# Altium schematic symbol library IC_TI.SCHLIB: 1162 symbols (part 1 of 8) (continued)
## CD4013BM96
designator U?
Integrated Circuit; Manufacturer_Name: Texas Instruments; Manufacturer_Part_Number: CD4013BM96; Datasheet Link: http://www.ti.com/lit/gpn/cd4013b; Height: 1.75mm; Mouser Part Number: 595-CD4013BM96; Mouser Price/Stock: https://www.mouser.com/Search/Refine.aspx?Keyword=595-CD4013BM96; RS Part Number: 6626825P; RS Price/Stock: http://uk.rs-online.com/web/p/products/6626825P
footprint SOIC14_1.27
pins: 1 Q1, 2 ~{Q1}, 3 CLOCK1, 4 RESET1, 5 D1, 6 SET1, 7 VSS, 8 SET2, 9 D2, 10 RESET2, 11 CLOCK2, 12 ~{Q2}, 13 Q2, 14 VDD

## CD4015BEE4
designator U?
Integrated Circuit; Manufacturer_Name: Texas Instruments; Manufacturer_Part_Number: CD4015BEE4; Datasheet Link: http://www.ti.com/lit/ds/symlink/cd4015b.pdf; Height: 5.08mm; Mouser Part Number: 595-CD4015BEE4; Mouser Price/Stock: https://www.mouser.com/Search/Refine.aspx?Keyword=595-CD4015BEE4; RS Part Number: 1450191; RS Price/Stock: http://uk.rs-online.com/web/p/products/1450191
footprint DIP16-A
pins: 1 CLK_B (in), 2 Q4_B, 3 Q3_A, 4 Q2_A, 5 Q1_A, 6 RESET_A, 7 DATA_A, 8 VSS (power), 9 CLK_A (in), 10 Q4_A, 11 Q3_B, 12 Q2_B, 13 Q1_B, 14 RESET_B, 15 DATA_B, 16 VDD (power)

## CD4015BM96
designator U?
Integrated Circuit; Manufacturer_Name: Texas Instruments; Manufacturer_Part_Number: CD4015BM96; Datasheet Link: http://www.ti.com/general/docs/lit/getliterature.tsp?genericPartNumber=CD4015B&&fileType=pdf; Height: 1.75mm; Mouser Part Number: 595-CD4015BM96; Mouser Price/Stock: https://www.mouser.com/Search/Refine.aspx?Keyword=595-CD4015BM96
footprint SOIC16_1.27
pins: 1 CLOCK_B, 2 Q4_B, 3 Q3_A, 4 Q2_A, 5 Q1_A, 6 RESET_A, 7 DATA_A, 8 VSS, 9 CLOCK_A, 10 Q4A, 11 Q3_B, 12 Q2_B, 13 Q1_B, 14 RESET_B, 15 DATA_B, 16 VDD

## CD4016BM
designator U?
Integrated Circuit; Manufacturer_Name: Texas Instruments; Manufacturer_Part_Number: CD4016BM; Datasheet Link: http://www.ti.com/lit/gpn/cd4016b; Mouser Part Number: 595-CD4016BM; Mouser Price/Stock: https://www.mouser.com/Search/Refine.aspx?Keyword=595-CD4016BM; RS Part Number: 1450847; RS Price/Stock: http://uk.rs-online.com/web/p/products/1450847
footprint SOIC14_1.27
pins: 1 SIGA_IN, 2 SIGA_OUT, 3 SIGB_IN, 4 SIGB_OUT, 5 CONTROL_B, 6 CONTROL_C, 7 VSS, 8 SIGC_IN, 9 SIGC_OUT, 10 SIGD_OUT, 11 SIGD_IN, 12 CONTROL_D, 13 CONTROL_A, 14 VDD

## CD4017BM
designator U?
Integrated Circuit; Manufacturer_Name: Texas Instruments; Manufacturer_Part_Number: CD4017BM; Datasheet Link: http://uk.rs-online.com/web/p/products/6629543; Height: 1.75mm; Mouser Part Number: 595-CD4017BM; Mouser Price/Stock: https://www.mouser.com/Search/Refine.aspx?Keyword=595-CD4017BM; RS Part Number: 9222896; RS Price/Stock: http://uk.rs-online.com/web/p/products/9222896
footprint SOIC16_1.27
pins: 1 5, 2 1, 3 0, 4 2, 5 6, 6 7, 7 3, 8 VSS, 9 8, 10 4, 11 9, 12 CARRY_OUT, 13 CLOCK_INHIBIT, 14 CLOCK, 15 RESET, 16 VDO

## CD4021BEE4
designator U?
Integrated Circuit; Manufacturer_Name: Texas Instruments; Manufacturer_Part_Number: CD4021BEE4; Datasheet Link: http://www.ti.com/lit/ds/symlink/cd4021b.pdf; Height: 5.08mm; Mouser Part Number: 595-CD4021BEE4; Mouser Price/Stock: https://www.mouser.com/Search/Refine.aspx?Keyword=595-CD4021BEE4; RS Part Number: 6629565P; RS Price/Stock: http://uk.rs-online.com/web/p/products/6629565P
footprint DIP16-A
pins: 1 P1-8, 2 Q6, 3 Q8, 4 P1-4, 5 P1-3, 6 P1-2, 7 P1-1, 8 VSS (power), 9 P/S_CTRL, 10 CLK (in), 11 SER_IN (in), 12 Q7, 13 P1-5, 14 P1-6, 15 P1-7, 16 VDD (power)

## CD4021BM
designator U?
Integrated Circuit; Manufacturer_Name: Texas Instruments; Manufacturer_Part_Number: CD4021BM; Datasheet Link: http://www.ti.com/lit/gpn/cd4021b; Height: 1.75mm; Mouser Part Number: 595-CD4021BM; Mouser Price/Stock: https://www.mouser.com/Search/Refine.aspx?Keyword=595-CD4021BM; RS Part Number: 6629569P; RS Price/Stock: http://uk.rs-online.com/web/p/products/6629569P
footprint SOIC16_1.27
pins: 1 PAR._IN_1, 2 Q6, 3 Q8, 4 PAR._IN_2, 5 PAR._IN_3, 6 PAR._IN_4, 7 PAR._IN_5, 8 VSS, 9 PAR_SER_CONT, 10 CLOCK, 11 SER._IN, 12 Q7, 13 PAR._IN_6, 14 PAR._IN_7, 15 PAR._IN_8, 16 VDD

## CD4023BEE4
designator U?
Integrated Circuit; Manufacturer_Name: Texas Instruments; Manufacturer_Part_Number: CD4023BEE4; Datasheet Link: http://www.ti.com/lit/ds/symlink/cd4023b.pdf; Height: 5.08mm; Mouser Part Number: 595-CD4023BEE4; Mouser Price/Stock: https://www.mouser.com/Search/Refine.aspx?Keyword=595-CD4023BEE4; RS Part Number: 1449999; RS Price/Stock: http://uk.rs-online.com/web/p/products/1449999
footprint DIP14-A
pins: 1 A, 2 B, 3 D, 4 E, 5 F, 6 K, 7 VSS (power), 8 C, 9 J, 10 L, 11 I, 12 H, 13 G, 14 VDD (power)

## CD4023BPWR
designator U?
Integrated Circuit; Manufacturer_Name: Texas Instruments; Manufacturer_Part_Number: CD4023BPWR; Datasheet Link: http://www.ti.com/lit/gpn/cd4023b; Height: 1.2mm; Mouser Part Number: 595-CD4023BPWR; Mouser Price/Stock: https://www.mouser.com/Search/Refine.aspx?Keyword=595-CD4023BPWR
footprint TSSOP14_0.65 (TSOP, 14-Leads, Body 5.00x4.40mm, Pitch 0.65mm, Thermal Pad 2.31x2.46mm, IPC Low Density)
pins: 1 A, 2 B, 3 D, 4 E, 5 F, 6 K~{DEF}, 7 VSS, 8 C, 9 J~{ABC}, 10 L~{GHI}, 11 I, 12 H, 13 G, 14 VDD

## CD4028BM
designator U?
Integrated Circuit; Manufacturer_Name: Texas Instruments; Manufacturer_Part_Number: CD4028BM; Datasheet Link: https://componentsearchengine.com/Datasheets/2/CD4028BM.pdf; Height: 1.75mm; Mouser Part Number: 595-CD4028BM; Mouser Price/Stock: https://www.mouser.com/Search/Refine.aspx?Keyword=595-CD4028BM
footprint SOIC16_1.27
pins: 1 4 (out), 2 (out), 3 0 (out), 4 7 (out), 5 9 (out), 6 5 (out), 7 6 (out), 8 VSS (power), 9 8 (out), 10 A (in), 11 D (in), 12 C (in), 13 B (in), 14 1 (out), 15 3 (out), 16 VDD (power)

## CD4040BEE4
designator U?
Integrated Circuit; Manufacturer_Name: Texas Instruments; Manufacturer_Part_Number: CD4040BEE4; Datasheet Link: http://www.ti.com/lit/ds/symlink/cd4020b.pdf; Height: 5.08mm; Mouser Part Number: 595-CD4040BEE4; Mouser Price/Stock: https://www.mouser.com/Search/Refine.aspx?Keyword=595-CD4040BEE4; RS Part Number: 2509293942; RS Price/Stock: http://uk.rs-online.com/web/p/products/2509293942
footprint DIP16-A
pins: 1 Q12, 2 Q6, 3 Q5, 4 Q7, 5 Q4, 6 Q3, 7 Q2, 8 VSS, 9 Q1, 10 INPUT_PULSES, 11 RESET, 12 Q9, 13 Q8, 14 Q10, 15 Q11, 16 VDD

## CD4040BM96
designator U?
Integrated Circuit; Manufacturer_Name: Texas Instruments; Manufacturer_Part_Number: CD4040BM96; Datasheet Link: http://www.ti.com/lit/gpn/cd4040b; Height: 1.75mm; Mouser Part Number: 595-CD4040BM96; Mouser Price/Stock: https://www.mouser.com/Search/Refine.aspx?Keyword=595-CD4040BM96
footprint SOIC16_1.27
pins: 1 Q12, 2 Q6_1, 3 Q5, 4 Q7, 5 Q4, 6 Q3, 7 Q2, 8 VSS, 9 QI, 10 Q, 11 R, 12 Q9, 13 Q6_2, 14 Q10, 15 Q11, 16 VDD

## CD4042BD
designator U?
Integrated Circuit; Manufacturer_Name: Texas Instruments; Manufacturer_Part_Number: CD4042BD; Mouser Part Number: 595-CD4042BD; Mouser Price/Stock: https://www.mouser.com/Search/Refine.aspx?Keyword=595-CD4042BD
footprint SOIC16_1.27
pins: 1 Q4, 2 Q1, 3 ~Q1, 4 D1, 5 CLOCK, 6 POLARITY, 7 D2, 8 VSS, 9 ~Q2, 10 Q2, 11 Q3, 12 ~Q3, 13 D3, 14 D4, 15 ~Q4, 16 VDD

## CD4042BEE4
designator U?
Integrated Circuit; Manufacturer_Name: Texas Instruments; Manufacturer_Part_Number: CD4042BEE4; Datasheet Link: http://www.ti.com/lit/ds/symlink/cd4042b.pdf; Height: 5.08mm; Mouser Part Number: 595-CD4042BEE4; Mouser Price/Stock: https://www.mouser.com/Search/Refine.aspx?Keyword=595-CD4042BEE4; RS Part Number: 7092378P; RS Price/Stock: http://uk.rs-online.com/web/p/products/7092378P
footprint DIP16-A
pins: 1 Q4, 2 Q1, 3 ~{Q1}, 4 D1, 5 CLK (in), 6 POL, 7 D2, 8 VSS (power), 9 ~{Q2}, 10 Q2, 11 Q3, 12 ~{Q3}, 13 D3, 14 D4, 15 ~{Q4}, 16 VDD (power)

## CD4043BDR
designator U?
Integrated Circuit; Manufacturer_Name: Texas Instruments; Manufacturer_Part_Number: CD4043BDR; Datasheet Link: http://www.ti.com/lit/ds/symlink/cd4043b.pdf; Height: 1.75mm; Mouser Part Number: 595-CD4043BDR; Mouser Price/Stock: https://www.mouser.com/Search/Refine.aspx?Keyword=595-CD4043BDR
footprint SOIC16_1.27
pins: 1 Q4, 2 Q1, 3 R1, 4 S1, 5 ENABLE, 6 S2, 7 R2, 8 VSS, 9 Q2, 10 Q3, 11 R3, 12 S3, 13 NC, 14 S4, 15 R4, 16 VDD

## CD4043BDW
designator U?
Integrated Circuit; Manufacturer_Name: Texas Instruments; Manufacturer_Part_Number: CD4043BDW; Datasheet Link: http://www.ti.com/lit/gpn/cd4043b; Height: 2.65mm; Mouser Part Number: 595-CD4043BDW; Mouser Price/Stock: https://www.mouser.com/Search/Refine.aspx?Keyword=595-CD4043BDW; RS Part Number: 8072353; RS Price/Stock: http://uk.rs-online.com/web/p/products/8072353
footprint SOIC16W_1.27
pins: 1 Q4, 2 Q1, 3 R1, 4 S1, 5 ENABLE, 6 S2, 7 R2, 8 VSS, 9 Q2, 10 Q3, 11 R3, 12 S3, 13 NC, 14 S4, 15 R4, 16 VDD

## CD4043BE
designator U?
Integrated Circuit; Manufacturer_Name: Texas Instruments; Manufacturer_Part_Number: CD4043BE; Datasheet Link: http://www.ti.com/lit/ds/symlink/cd4043b.pdf; Height: 5.08mm; Mouser Part Number: 595-CD4043BE; Mouser Price/Stock: https://www.mouser.com/Search/Refine.aspx?Keyword=595-CD4043BE; RS Part Number: 2508238859; RS Price/Stock: http://uk.rs-online.com/web/p/products/2508238859
footprint DIP16-A
pins: 1 Q4, 2 Q1, 3 R1, 4 S1, 5 ENABLE, 6 S2, 7 R2, 8 VSS (power), 9 Q2, 10 Q3, 11 R3, 12 S3, 13 NC, 14 S4, 15 R4, 16 VDD (power)

## CD4046BEE4
designator U?
Integrated Circuit; Manufacturer_Name: Texas Instruments; Manufacturer_Part_Number: CD4046BEE4; Datasheet Link: http://www.ti.com/lit/ds/symlink/cd4046b.pdf; Height: 5.08mm; Mouser Part Number: 595-CD4046BEE4; Mouser Price/Stock: https://www.mouser.com/Search/Refine.aspx?Keyword=595-CD4046BEE4; RS Part Number: 7091965P; RS Price/Stock: http://au.rs-online.com/web/p/products/7091965P
footprint DIP16-A
pins: 1 PP, 2 PC1_OUT (out), 3 COMP, 4 VCOOUT (out), 5 INH (in), 6 C1_1, 7 C1_2, 8 VSS (power), 9 VCOIN (in), 10 DEMO_OUT (out), 11 R1, 12 R2, 13 PC2_OUT (out), 14 SIG, 15 ZENER, 16 VDD (power)

## CD4046BPW
designator U?
Integrated Circuit; Manufacturer_Name: Texas Instruments; Manufacturer_Part_Number: CD4046BPW; Datasheet Link: http://www.ti.com/lit/ds/symlink/cd4046b.pdf; Height: 1.2mm; Mouser Part Number: 595-CD4046BPW; Mouser Price/Stock: https://www.mouser.com/Search/Refine.aspx?Keyword=595-CD4046BPW; RS Part Number: 1451118; RS Price/Stock: http://au.rs-online.com/web/p/products/1451118
footprint TSSOP16_0.65 (Shrink Small Outline; 16 Leads; Body Width 4.4 mm; Pitch 0.65 mm)
pins: 1 PHASE_PULSES, 2 PHASE_COMP_I_OUT, 3 COMPARATOR_IN, 4 VCO_OUT, 5 INHIBIT, 6 CI(1), 7 CI(2), 8 VSS (power), 9 VCO_IN, 10 DEMODULATOR_OUT, 11 R1_TO_VSS, 12 R2_TO_VSS, 13 PHASE_COMP_II_OUT, 14 SIGNAL_IN, 15 ZENER, 16 VDD (power)

## CD4047BE
designator U?
Integrated Circuit; Manufacturer_Name: Texas Instruments; Manufacturer_Part_Number: CD4047BE; Datasheet Link: http://www.ti.com/lit/ds/symlink/cd4047b.pdf; Height: 5.08mm; Mouser Part Number: 595-CD4047BE; Mouser Price/Stock: https://www.mouser.com/Search/Refine.aspx?Keyword=595-CD4047BE; RS Part Number: 2508238887; RS Price/Stock: http://uk.rs-online.com/web/p/products/2508238887
footprint DIP14-A
pins: 1 C, 2 R, 3 R-C_COMMON, 4 ~{ASTABLE}, 5 ASTABLE, 6 -TRIGGER, 7 VSS (power), 8 +TRIGGER, 9 EXT.RESERT, 10 Q, 11 ~{Q}, 12 RETRIGGER, 13 OSCOUT (out), 14 VDD (power)

## CD4047BM
designator U?
Integrated Circuit; Manufacturer_Name: Texas Instruments; Manufacturer_Part_Number: CD4047BM; Datasheet Link: http://www.ti.com/lit/gpn/cd4047b; Mouser Part Number: 595-CD4047BM; Mouser Price/Stock: https://www.mouser.com/Search/Refine.aspx?Keyword=595-CD4047BM; RS Part Number: 1450420; RS Price/Stock: http://uk.rs-online.com/web/p/products/1450420
footprint SOIC14_1.27
pins: 1 C, 2 R, 3 R-C_COMMON, 4 ~ASTABLE, 5 ASTABL, 6 -TRIGGER, 7 VSS, 8 +TRIGGER, 9 EXT_RESET, 10 Q, 11 ~Q, 12 RETRIGGER, 13 OSC_OUT, 14 VDD

## CD4049UBDR
designator U?
Integrated Circuit; Manufacturer_Name: Texas Instruments; Manufacturer_Part_Number: CD4049UBDR; Datasheet Link: http://www.ti.com/lit/gpn/cd4049ub; Height: 1.75mm; Mouser Part Number: 595-CD4049UBDR; Mouser Price/Stock: https://www.mouser.com/Search/Refine.aspx?Keyword=595-CD4049UBDR
footprint SOIC16_1.27
pins: 1 VCC, 2 G, 3 A, 4 H, 5 B, 6 I, 7 C, 8 VSS, 9 D, 10 J, 11 E, 12 K, 13 NC_1, 14 F, 15 L, 16 NC_2

## CD4049UBE
designator U?
Integrated Circuit; Manufacturer_Name: Texas Instruments; Manufacturer_Part_Number: CD4049UBE; Datasheet Link: http://www.ti.com/lit/ds/symlink/cd4049ub.pdf; Height: 5.08mm; Mouser Part Number: 595-CD4049UBE; Mouser Price/Stock: https://www.mouser.com/Search/Refine.aspx?Keyword=595-CD4049UBE; RS Part Number: 2508238893; RS Price/Stock: http://uk.rs-online.com/web/p/products/2508238893
footprint DIP16-A
pins: 1 VCC (power), 2 G=~{A}, 3 A, 4 H=~{B}, 5 B, 6 I=~{C}, 7 C, 8 VSS (power), 9 D, 10 J=~{D}, 11 E, 12 K=~{E}, 13 NC, 14 F, 15 L=~{F}, 16 NC_1

## CD4051BEE4
designator U?
Integrated Circuit; Manufacturer_Name: Texas Instruments; Manufacturer_Part_Number: CD4051BEE4; Datasheet Link: http://www.ti.com/lit/ds/symlink/cd4051b.pdf; Height: 5.08mm; Mouser Part Number: 595-CD4051BEE4; Mouser Price/Stock: https://www.mouser.com/Search/Refine.aspx?Keyword=595-CD4051BEE4; RS Part Number: 9236700; RS Price/Stock: http://uk.rs-online.com/web/p/products/9236700
footprint DIP16-A
pins: 1 CHANNELS_IN/OUT_4 (out), 2 CHANNELS_IN/OUT_6 (out), 3 COM_O/I, 4 CHANNELS_IN/OUT_7 (out), 5 CHANNELS_IN/OUT_5 (out), 6 INH (in), 7 VEE, 8 VSS (power), 9 C, 10 B, 11 A, 12 CHANNELS_IN/OUT_3 (out), 13 CHANNELS_IN/OUT_0 (out), 14 CHANNELS_IN/OUT_1 (out), 15 CHANNELS_IN/OUT_2 (out), 16 VDD (power)

## CD4051BM96
designator U?
Integrated Circuit; Manufacturer_Name: Texas Instruments; Manufacturer_Part_Number: CD4051BM96; Datasheet Link: http://www.ti.com/general/docs/lit/getliterature.tsp?genericPartNumber=CD4051B&&fileType=pdf; Height: 1.75mm; Mouser Part Number: 595-CD4051BM96; Mouser Price/Stock: https://www.mouser.com/Search/Refine.aspx?Keyword=595-CD4051BM96; RS Part Number: 1788947; RS Price/Stock: http://uk.rs-online.com/web/p/products/1788947
footprint SOIC16_1.27
pins: 1 CH_4_IN/OUT, 2 CH_6_IN/OUT, 3 COM_OUT/IN, 4 CH_7_IN/OUT, 5 CH_5_IN/OUT, 6 INH, 7 VEE, 8 VSS, 9 C, 10 B, 11 A, 12 CH3_IN/OUT, 13 CH0_IN/OUT, 14 CH1_IN/OUT, 15 CH2_IN/OUT, 16 VDD

## CD4051BPW
designator U?
Integrated Circuit; Manufacturer_Name: Texas Instruments; Manufacturer_Part_Number: CD4051BPW; Mouser Part Number: 595-CD4051BPW; Mouser Price/Stock: https://www.mouser.com/Search/Refine.aspx?Keyword=595-CD4051BPW
footprint TSSOP16_0.65 (Shrink Small Outline; 16 Leads; Body Width 4.4 mm; Pitch 0.65 mm)
pins: 1 4, 2 6, 3 COM_OUT/IN, 4 7, 5, 6 INH, 7 VEE, 8 VSS, 9 C, 10 B, 11 A, 12 3, 13 0, 14 1, 15 2, 16 VDD

## CD4052BEE4
designator U?
Integrated Circuit; Manufacturer_Name: Texas Instruments; Manufacturer_Part_Number: CD4052BEE4; Datasheet Link: http://www.ti.com/lit/ds/symlink/cd4051b.pdf; Height: 5.08mm; Mouser Part Number: 595-CD4052BEE4; Mouser Price/Stock: https://www.mouser.com/Search/Refine.aspx?Keyword=595-CD4052BEE4; RS Part Number: 7091980P; RS Price/Stock: http://uk.rs-online.com/web/p/products/7091980P
footprint DIP16-A
pins: 1 Y_IN/OUT_0 (out), 2 Y_IN/OUT_2 (out), 3 Y_OUT/IN (out), 4 Y_IN/OUT_3 (out), 5 Y_IN/OUT_1 (out), 6 INH (in), 7 VEE, 8 VSS (power), 9 B, 10 A, 11 X_IN/OUT_3 (out), 12 X_IN/OUT_0 (out), 13 X_OUT/IN (out), 14 X_IN/OUT_1 (out), 15 X_IN/OUT_2 (out), 16 VDD (power)

## CD4052BM
designator U?
Integrated Circuit; Manufacturer_Name: Texas Instruments; Manufacturer_Part_Number: CD4052BM; Datasheet Link: http://www.ti.com/lit/ds/symlink/cd4052b.pdf; Height: 1.75mm; Mouser Part Number: 595-CD4052BM; Mouser Price/Stock: https://www.mouser.com/Search/Refine.aspx?Keyword=595-CD4052BM; RS Part Number: 6622656P; RS Price/Stock: http://uk.rs-online.com/web/p/products/6622656P
footprint SOIC16_1.27
pins: 1 0Y, 2 2Y, 3 Y, 4 3Y, 5 1Y, 6 INH (in), 7 VEE, 8 VSS (power), 9 B, 10 A, 11 3X, 12 0X, 13 X, 14 1X, 15 2X, 16 VDD (power)

## CD4053BM96
designator U?
Integrated Circuit; Manufacturer_Name: Texas Instruments; Manufacturer_Part_Number: CD4053BM96; Datasheet Link: http://www.ti.com/lit/ds/symlink/cd4053b.pdf; Height: 1.75mm; Mouser Part Number: 595-CD4053BM96; Mouser Price/Stock: https://www.mouser.com/Search/Refine.aspx?Keyword=595-CD4053BM96; RS Part Number: 1788952; RS Price/Stock: http://uk.rs-online.com/web/p/products/1788952
footprint SOIC16_1.27
pins: 1 BY, 2 BX, 3 CY_1, 4 OUT/IN_CX_OR_CY (out), 5 IN/OUT_CX (out), 6 INH (in), 7 VEE, 8 VSS (power), 9 CY_2, 10 B, 11 A, 12 AX, 13 AY, 14 OUT/IN_AX_OR_AY (out), 15 OUT/IN_BX_OR_BY (out), 16 VDD (power)

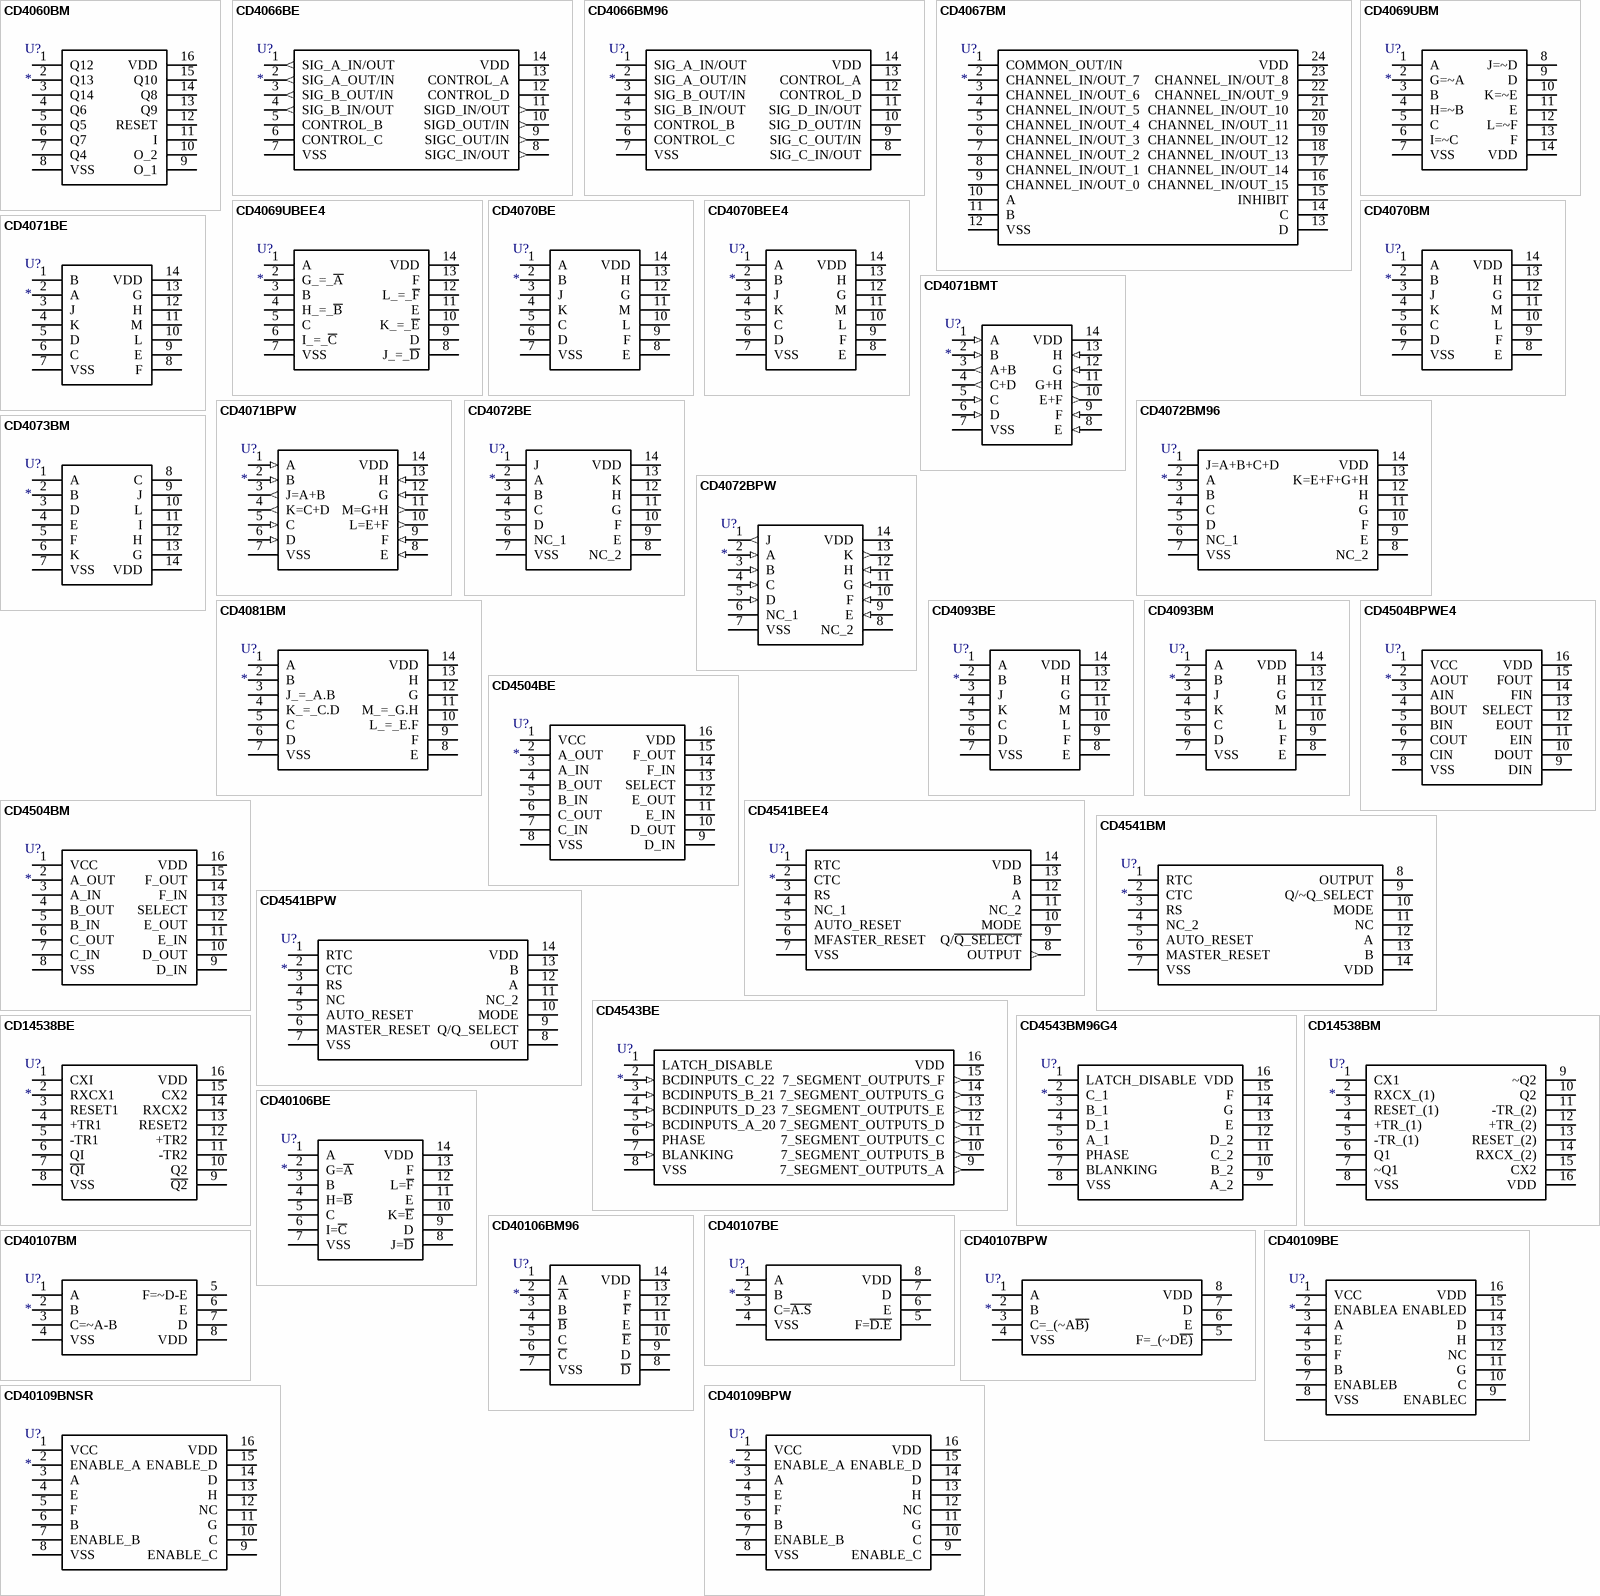
[diagram p4: symbols CD4060BM to CD40109BPW]

## CD4060BM
designator U?
Integrated Circuit; Manufacturer_Name: Texas Instruments; Manufacturer_Part_Number: CD4060BM; Datasheet Link: http://www.ti.com/lit/gpn/cd4060b; Height: 1.75mm; Mouser Part Number: 595-CD4060BM; Mouser Price/Stock: https://www.mouser.com/Search/Refine.aspx?Keyword=595-CD4060BM; RS Part Number: 1456607; RS Price/Stock: http://uk.rs-online.com/web/p/products/1456607
footprint SOIC16_1.27
pins: 1 Q12, 2 Q13, 3 Q14, 4 Q6, 5 Q5, 6 Q7, 7 Q4, 8 VSS, 9 O_1, 10 O_2, 11 I, 12 RESET, 13 Q9, 14 Q8, 15 Q10, 16 VDD

## CD4066BE
designator U?
Integrated Circuit; Manufacturer_Name: Texas Instruments; Manufacturer_Part_Number: CD4066BE; Datasheet Link: http://docs-emea.rs-online.com/webdocs/0b73/0900766b80b734d0.pdf; Height: 5.08mm; Mouser Part Number: 595-CD4066BE; Mouser Price/Stock: https://www.mouser.com/Search/Refine.aspx?Keyword=595-CD4066BE; RS Part Number: 2508239032; RS Price/Stock: http://uk.rs-online.com/web/p/products/2508239032
footprint DIP14-A
pins: 1 SIG_A_IN/OUT (out), 2 SIG_A_OUT/IN (out), 3 SIG_B_OUT/IN (out), 4 SIG_B_IN/OUT (out), 5 CONTROL_B, 6 CONTROL_C, 7 VSS (power), 8 SIGC_IN/OUT (out), 9 SIGC_OUT/IN (out), 10 SIGD_OUT/IN (out), 11 SIGD_IN/OUT (out), 12 CONTROL_D, 13 CONTROL_A, 14 VDD (power)

## CD4066BM96
designator U?
Integrated Circuit; Manufacturer_Name: Texas Instruments; Manufacturer_Part_Number: CD4066BM96; Datasheet Link: http://www.ti.com/lit/gpn/cd4066b; Height: 1.75mm; Mouser Part Number: 595-CD4066BM96; Mouser Price/Stock: https://www.mouser.com/Search/Refine.aspx?Keyword=595-CD4066BM96; RS Part Number: 1788951; RS Price/Stock: http://uk.rs-online.com/web/p/products/1788951
footprint SOIC14_1.27
pins: 1 SIG_A_IN/OUT, 2 SIG_A_OUT/IN, 3 SIG_B_OUT/IN, 4 SIG_B_IN/OUT, 5 CONTROL_B, 6 CONTROL_C, 7 VSS, 8 SIG_C_IN/OUT, 9 SIG_C_OUT/IN, 10 SIG_D_OUT/IN, 11 SIG_D_IN/OUT, 12 CONTROL_D, 13 CONTROL_A, 14 VDD

## CD4067BM
designator U?
Integrated Circuit; Manufacturer_Name: Texas Instruments; Manufacturer_Part_Number: CD4067BM; Datasheet Link: http://www.ti.com/lit/ds/symlink/cd4067b.pdf; Height: 2.65mm; Mouser Part Number: 595-CD4067BM; Mouser Price/Stock: https://www.mouser.com/Search/Refine.aspx?Keyword=595-CD4067BM; RS Part Number: 8096208P; RS Price/Stock: http://uk.rs-online.com/web/p/products/8096208P
footprint SOIC24W_1.27
pins: 1 COMMON_OUT/IN, 2 CHANNEL_IN/OUT_7, 3 CHANNEL_IN/OUT_6, 4 CHANNEL_IN/OUT_5, 5 CHANNEL_IN/OUT_4, 6 CHANNEL_IN/OUT_3, 7 CHANNEL_IN/OUT_2, 8 CHANNEL_IN/OUT_1, 9 CHANNEL_IN/OUT_0, 10 A, 11 B, 12 VSS, 13 D, 14 C, 15 INHIBIT, 16 CHANNEL_IN/OUT_15, 17 CHANNEL_IN/OUT_14, 18 CHANNEL_IN/OUT_13, 19 CHANNEL_IN/OUT_12, 20 CHANNEL_IN/OUT_11, 21 CHANNEL_IN/OUT_10, 22 CHANNEL_IN/OUT_9, 23 CHANNEL_IN/OUT_8, 24 VDD

## CD4069UBEE4
designator U?
Integrated Circuit; Manufacturer_Name: Texas Instruments; Manufacturer_Part_Number: CD4069UBEE4; Datasheet Link: http://www.ti.com/general/docs/lit/getliterature.tsp?genericPartNumber=CD4069UB&&fileType=pdf; Height: 5.08mm; Mouser Part Number: 595-CD4069UBEE4; Mouser Price/Stock: https://www.mouser.com/Search/Refine.aspx?Keyword=595-CD4069UBEE4; RS Part Number: 2509293958; RS Price/Stock: http://uk.rs-online.com/web/p/products/2509293958
footprint DIP14-A
pins: 1 A, 2 G_=_~{A}, 3 B, 4 H_=_~{B}, 5 C, 6 I_=_~{C}, 7 VSS, 8 J_=_~{D}, 9 D, 10 K_=_~{E}, 11 E, 12 L_=_~{F}, 13 F, 14 VDD

## CD4069UBM
designator U?
Integrated Circuit; Manufacturer_Name: Texas Instruments; Manufacturer_Part_Number: CD4069UBM; Datasheet Link: http://www.ti.com/lit/gpn/cd4069ub; Mouser Part Number: 595-CD4069UBM; Mouser Price/Stock: https://www.mouser.com/Search/Refine.aspx?Keyword=595-CD4069UBM; RS Part Number: 6629650P; RS Price/Stock: http://uk.rs-online.com/web/p/products/6629650P
footprint SOIC14_1.27
pins: 1 A, 2 G=~A, 3 B, 4 H=~B, 5 C, 6 I=~C, 7 VSS, 8 J=~D, 9 D, 10 K=~E, 11 E, 12 L=~F, 13 F, 14 VDD

## CD4070BE
designator U?
Integrated Circuit; Manufacturer_Name: Texas Instruments; Manufacturer_Part_Number: CD4070BE; Datasheet Link: http://docs-emea.rs-online.com/webdocs/0b73/0900766b80b73c67.pdf; Height: 5.08mm; Mouser Part Number: 595-CD4070BE; Mouser Price/Stock: https://www.mouser.com/Search/Refine.aspx?Keyword=595-CD4070BE; RS Part Number: 2508242476; RS Price/Stock: http://uk.rs-online.com/web/p/products/2508242476
footprint DIP14-A
pins: 1 A, 2 B, 3 J, 4 K, 5 C, 6 D, 7 VSS (power), 8 E, 9 F, 10 L, 11 M, 12 G, 13 H, 14 VDD (power)

## CD4070BEE4
designator U?
Integrated Circuit; Manufacturer_Name: Texas Instruments; Manufacturer_Part_Number: CD4070BEE4; Datasheet Link: http://docs-emea.rs-online.com/webdocs/0b73/0900766b80b73c67.pdf; Height: 5.08mm; Mouser Part Number: 595-CD4070BEE4; Mouser Price/Stock: https://www.mouser.com/Search/Refine.aspx?Keyword=595-CD4070BEE4; RS Part Number: 1450728; RS Price/Stock: http://uk.rs-online.com/web/p/products/1450728
footprint DIP14-A
pins: 1 A, 2 B, 3 J, 4 K, 5 C, 6 D, 7 VSS (power), 8 E, 9 F, 10 L, 11 M, 12 G, 13 H, 14 VDD (power)

## CD4070BM
designator U?
Integrated Circuit; Manufacturer_Name: Texas Instruments; Manufacturer_Part_Number: CD4070BM; Datasheet Link: http://docs-emea.rs-online.com/webdocs/0e6d/0900766b80e6d4a1.pdf; Height: 1.75mm; Mouser Part Number: 595-CD4070BM; Mouser Price/Stock: https://www.mouser.com/Search/Refine.aspx?Keyword=595-CD4070BM; RS Part Number: 1451087; RS Price/Stock: http://uk.rs-online.com/web/p/products/1451087
footprint SOIC14_1.27
pins: 1 A, 2 B, 3 J, 4 K, 5 C, 6 D, 7 VSS (power), 8 E, 9 F, 10 L, 11 M, 12 G, 13 H, 14 VDD (power)

## CD4071BE
designator U?
Integrated Circuit; Manufacturer_Name: Texas Instruments; Manufacturer_Part_Number: CD4071BE; Datasheet Link: http://www.ti.com/lit/ds/symlink/cd4071b.pdf; Height: 5.08mm; Mouser Part Number: 595-CD4071BE; Mouser Price/Stock: https://www.mouser.com/Search/Refine.aspx?Keyword=595-CD4071BE; RS Part Number: 2508242498; RS Price/Stock: http://uk.rs-online.com/web/p/products/2508242498
footprint DIP14-A
pins: 1 B, 2 A, 3 J, 4 K, 5 D, 6 C, 7 VSS (power), 8 F, 9 E, 10 L, 11 M, 12 H, 13 G, 14 VDD (power)

## CD4071BMT
designator U?
Integrated Circuit; Manufacturer_Name: Texas Instruments; Manufacturer_Part_Number: CD4071BMT; Datasheet Link: http://www.ti.com/lit/ds/symlink/cd4071b.pdf; Height: 1.75mm; Mouser Part Number: 595-CD4071BMT; Mouser Price/Stock: https://www.mouser.com/Search/Refine.aspx?Keyword=595-CD4071BMT
footprint SOIC14_1.27
pins: 1 A (in), 2 B (in), 3 A+B (out), 4 C+D (out), 5 C (in), 6 D (in), 7 VSS (power), 8 E (in), 9 F (in), 10 E+F (out), 11 G+H (out), 12 G (in), 13 H (in), 14 VDD (power)

## CD4071BPW
designator U?
Integrated Circuit; Manufacturer_Name: Texas Instruments; Manufacturer_Part_Number: CD4071BPW; Datasheet Link: http://www.ti.com/lit/ds/symlink/cd4071b.pdf; Height: 1.2mm; Mouser Part Number: 595-CD4071BPW; Mouser Price/Stock: https://www.mouser.com/Search/Refine.aspx?Keyword=595-CD4071BPW; RS Part Number: 1450764; RS Price/Stock: http://uk.rs-online.com/web/p/products/1450764
footprint TSSOP14_0.65 (TSOP, 14-Leads, Body 5.00x4.40mm, Pitch 0.65mm, Thermal Pad 2.31x2.46mm, IPC Low Density)
pins: 1 A (in), 2 B (in), 3 J=A+B (out), 4 K=C+D (out), 5 C (in), 6 D (in), 7 VSS (power), 8 E (in), 9 F (in), 10 L=E+F (out), 11 M=G+H (out), 12 G (in), 13 H (in), 14 VDD (power)

## CD4072BE
designator U?
Integrated Circuit; Manufacturer_Name: Texas Instruments; Manufacturer_Part_Number: CD4072BE; Datasheet Link: http://docs-emea.rs-online.com/webdocs/1290/0900766b8129083e.pdf; Height: 5.08mm; Mouser Part Number: 595-CD4072BE; Mouser Price/Stock: https://www.mouser.com/Search/Refine.aspx?Keyword=595-CD4072BE; RS Part Number: 7967941P; RS Price/Stock: http://uk.rs-online.com/web/p/products/7967941P
footprint DIP14-A
pins: 1 J, 2 A, 3 B, 4 C, 5 D, 6 NC_1, 7 VSS (power), 8 NC_2 (power), 9 E, 10 F, 11 G, 12 H, 13 K, 14 VDD (power)

## CD4072BM96
designator U?
Integrated Circuit; Manufacturer_Name: Texas Instruments; Manufacturer_Part_Number: CD4072BM96; Datasheet Link: http://www.ti.com/lit/gpn/cd4072b; Height: 1.75mm; Mouser Part Number: 595-CD4072BM96; Mouser Price/Stock: https://www.mouser.com/Search/Refine.aspx?Keyword=595-CD4072BM96
footprint SOIC14_1.27
pins: 1 J=A+B+C+D, 2 A, 3 B, 4 C, 5 D, 6 NC_1, 7 VSS, 8 NC_2, 9 E, 10 F, 11 G, 12 H, 13 K=E+F+G+H, 14 VDD

## CD4072BPW
designator U?
Integrated Circuit; Manufacturer_Name: Texas Instruments; Manufacturer_Part_Number: CD4072BPW; Datasheet Link: http://www.ti.com/lit/ds/symlink/cd4071b.pdf; Height: 1.2mm; Mouser Part Number: 595-CD4072BPW; Mouser Price/Stock: https://www.mouser.com/Search/Refine.aspx?Keyword=595-CD4072BPW; RS Part Number: 8095517P; RS Price/Stock: http://uk.rs-online.com/web/p/products/8095517P
footprint TSSOP14_0.65 (TSOP, 14-Leads, Body 5.00x4.40mm, Pitch 0.65mm, Thermal Pad 2.31x2.46mm, IPC Low Density)
pins: 1 J (out), 2 A (in), 3 B (in), 4 C (in), 5 D (in), 6 NC_1, 7 VSS (power), 8 NC_2, 9 E (in), 10 F (in), 11 G (in), 12 H (in), 13 K (out), 14 VDD (power)

## CD4073BM
designator U?
Integrated Circuit; Manufacturer_Name: Texas Instruments; Manufacturer_Part_Number: CD4073BM; Datasheet Link: http://componentsearchengine.com/Datasheets/1/CD4073BM.pdf; Mouser Part Number: 595-CD4073BM; Mouser Price/Stock: https://www.mouser.com/Search/Refine.aspx?Keyword=595-CD4073BM
footprint SOIC14_1.27
pins: 1 A, 2 B, 3 D, 4 E, 5 F, 6 K, 7 VSS, 8 C, 9 J, 10 L, 11 I, 12 H, 13 G, 14 VDD

## CD4081BM
designator U?
Integrated Circuit; Manufacturer_Name: Texas Instruments; Manufacturer_Part_Number: CD4081BM; Datasheet Link: http://www.ti.com/lit/ds/symlink/cd4081b.pdf; Height: 1.75mm; Mouser Part Number: 595-CD4081BM; Mouser Price/Stock: https://www.mouser.com/Search/Refine.aspx?Keyword=595-CD4081BM; RS Part Number: 6629679P; RS Price/Stock: http://uk.rs-online.com/web/p/products/6629679P
footprint SOIC14_1.27
pins: 1 A, 2 B, 3 J_=_A.B, 4 K_=_C.D, 5 C, 6 D, 7 VSS (power), 8 E, 9 F, 10 L_=_E.F, 11 M_=_G.H, 12 G, 13 H, 14 VDD (power)